# Altium footprint library Connectors.PcbLib: 408 footprints (part 20 of 26)
Each footprint in its own frame and in the unit in brackets; x right, y up, seen from the top. Pads: shape width x height; smd on the part's side, far side on the other; paste and mask are expansions set on the pad; w line width, h text height; cw(c..) or ccw(c..) is an arc to the next point about the centre after c.
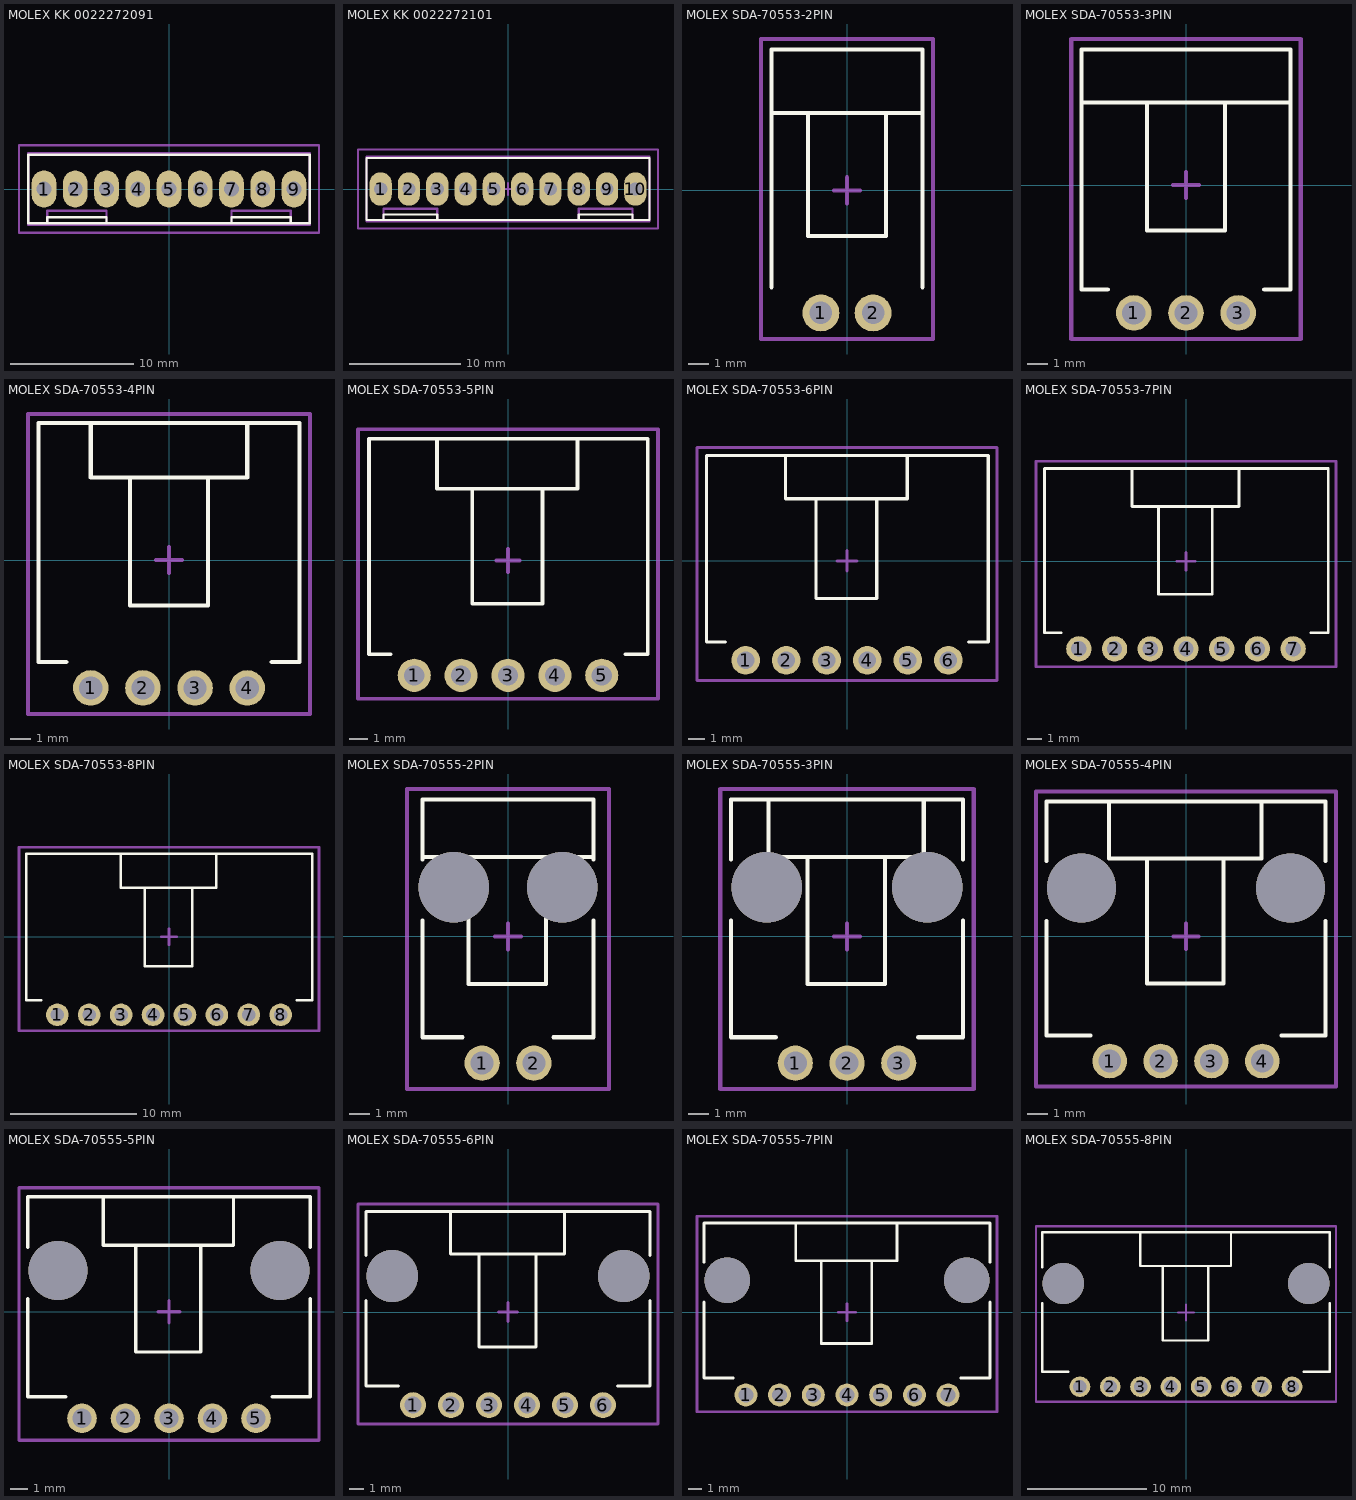
[diagram p19: the footprints below, top view; thin cyan lines are the x and y axes]

## MOLEX KK 0022272091 [mm]
height 11.6
pads (9):
  oval 2x3 hole 1.2: 1(-10.16,0) 2(-7.62,0) 3(-5.08,0) 4(-2.54,0) 5(0,0) 6(2.54,0) 7(5.08,0) 8(7.62,0) 9(10.16,0)
Top Overlay:
  lines w0.2: -9.906,-2.794 -9.906,-2.286 -5.08,-2.286 -5.08,-2.794 ; 5.08,-2.794 5.08,-2.286 9.906,-2.286 9.906,-2.794 ; -11.43,-2.794 -11.43,2.794 11.43,2.794 11.43,-2.794 -11.43,-2.794
Mechanical 13:
  lines w0.2: -9.906,-2.9 -9.906,-1.778 -5.08,-1.778 -5.08,-2.9 ; 5.08,-2.9 5.08,-1.778 9.906,-1.778 9.906,-2.9 ; -11.43,-2.9 11.43,-2.9 11.43,2.9 -11.43,2.9 -11.43,-2.9
Mechanical 15:
  lines w0.2: -0.508,0 0.508,0 ; 0,-0.508 0,0.508 ; -12.192,-3.556 12.192,-3.556 12.192,-1.016 12.192,3.556 -12.192,3.556 -12.192,-3.556
3D body "MOLEX KK 022272091.STEP": height 11.7, standoff -3.56, extent -11.43,-2.9 11.43,2.9

## MOLEX KK 0022272101 [mm]
height 11.6
pads (10):
  oval 2x3 hole 1.2: 1(-11.43,0) 2(-8.89,0) 3(-6.35,0) 4(-3.81,0) 5(-1.27,0) 6(1.27,0) 7(3.81,0) 8(6.35,0) 9(8.89,0) 10(11.43,0)
Top Overlay:
  lines w0.2: -11.176,-2.794 -11.176,-2.286 -6.35,-2.286 -6.35,-2.794 ; 6.35,-2.794 6.35,-2.286 11.176,-2.286 11.176,-2.794 ; -12.7,-2.794 12.7,-2.794 12.7,2.794 -12.7,2.794 -12.7,-2.794
Mechanical 13:
  lines w0.2: -11.176,-2.9 -11.176,-1.778 -6.35,-1.778 -6.35,-2.9 ; 6.35,-2.9 6.35,-1.778 11.176,-1.778 11.176,-2.9 ; -12.7,-2.9 -12.7,2.9 12.7,2.9 12.7,-2.9 -12.7,-2.9
Mechanical 15:
  lines w0.2: -0.508,0 0.508,0 ; 0,-0.508 0,0.508 ; -13.462,-3.556 -13.462,3.556 13.462,3.556 13.462,-1.016 13.462,-3.556 -13.462,-3.556
3D body "MOLEX KK 022272101.STEP": height 11.7, standoff -3.56, extent -12.7,-2.9 12.7,2.9

## MOLEX SDA-70553-2PIN [mm] "SL Right angle header with latch, 0.100 centres, SDA-70553"
height 6.99
pads (2):
  round 1.8 hole 1.09: 1(-1.27,-5.969) 2(1.27,-5.969)
Top Overlay:
  lines w0.2: -3.683,-4.719 -3.683,6.858 3.683,6.858 3.683,-4.719 ; -3.627,3.765 3.683,3.765 ; -1.905,3.765 -1.905,-2.219 1.905,-2.219 1.905,3.765
Mechanical 15:
  lines w0.2: -0.635,0 0.635,0 ; 0,-0.635 0,0.635 ; -4.191,-7.239 -4.191,7.366 4.191,7.366 4.191,-7.239 -4.191,-7.239
3D body "705530001.STEP": height 6.96, standoff -3.32, extent -3.683,-6.719 3.683,6.87

## MOLEX SDA-70553-3PIN [mm] "SL Right Angle Header W/LAtch & Trip-Pegs 2.54mm Centres"
height 6.99
pads (3):
  round 1.73 hole 1.13: 1(-2.54,-6.223) 2(0,-6.223) 3(2.54,-6.223)
Top Overlay:
  lines w0.2: -5.08,4.019 5.08,4.019 ; -3.81,-5.08 -5.08,-5.08 -5.08,6.604 5.08,6.604 5.08,-5.08 3.81,-5.08 ; -1.905,4.019 -1.905,-2.219 1.905,-2.219 1.905,4.019
Mechanical 15:
  lines w0.2: -0.635,0 0.635,0 ; 0,-0.635 0,0.635 ; -5.588,-7.493 -5.588,7.112 5.588,7.112 5.588,-7.493 -4.953,-7.493 -5.588,-7.493
3D body "705530002.STEP": height 6.98, standoff -3.3, extent -5.08,-6.923 5.08,6.666

## MOLEX SDA-70553-4PIN [mm] "SL Right Angle Header W/LAtch & Trip-Pegs 2.54mm Centres"
height 6.99
pads (4):
  round 1.73 hole 1.13: 1(-3.81,-6.223) 2(-1.27,-6.223) 3(1.27,-6.223) 4(3.81,-6.223)
Top Overlay:
  lines w0.2: -5,-4.953 -6.35,-4.953 -6.35,6.677 6.35,6.677 6.35,-4.953 5,-4.953 ; -3.81,6.677 -3.81,4.019 3.81,4.019 3.81,6.677 ; -1.905,4.019 -1.905,-2.219 1.905,-2.219 1.905,4.019
Mechanical 15:
  lines w0.2: -0.635,0 0.635,0 ; 0,-0.635 0,0.635 ; -6.858,-7.493 -6.858,7.112 6.858,7.112 6.858,-7.493 -6.858,-7.493
3D body "705530003.STEP": height 6.98, standoff -3.3, extent -6.35,-6.923 6.35,6.666

## MOLEX SDA-70553-5PIN [mm] "SL Right angle header with latch, 0.100 centres, SDA-70553"
height 6.99
pads (5):
  round 1.8 hole 1.09: 1(-5.08,-6.223) 2(-2.54,-6.223) 3(0,-6.223) 4(2.54,-6.223) 5(5.08,-6.223)
Top Overlay:
  lines w0.2: -6.35,-5.08 -7.533,-5.08 -7.533,-4.973 -7.533,6.604 7.58,6.604 7.58,-4.973 7.58,-5.08 6.35,-5.08 ; -3.85,6.55 -3.85,3.892 3.77,3.892 3.77,6.55 ; -1.945,3.892 -1.945,-2.346 1.865,-2.346 1.865,3.892
Mechanical 15:
  lines w0.2: -0.635,0 0.635,0 ; 0,-0.635 0,0.635 ; -8.128,-7.493 8.128,-7.493 8.128,7.112 -8.128,7.112 -8.128,-7.493
3D body "705530004.STEP": height 6.96, standoff -3.32, extent -7.58,-6.973 7.66,6.616

## MOLEX SDA-70553-6PIN [mm] "SL Right angle header with latch, 0.100 centres, SDA-70553"
height 6.99
pads (6):
  round 1.8 hole 1.09: 1(-6.35,-6.223) 2(-3.81,-6.223) 3(-1.27,-6.223) 4(1.27,-6.223) 5(3.81,-6.223) 6(6.35,-6.223)
Top Overlay:
  lines w0.2: -7.62,-5.08 -8.803,-5.08 -8.803,-4.973 -8.803,6.604 8.85,6.604 8.85,-4.973 8.85,-5.08 7.62,-5.08 ; -3.85,6.55 -3.85,3.892 3.77,3.892 3.77,6.55 ; -1.945,3.892 -1.945,-2.346 1.865,-2.346 1.865,3.892
Mechanical 15:
  lines w0.2: -0.635,0 0.635,0 ; 0,-0.635 0,0.635 ; -9.398,-7.493 -9.398,7.112 9.398,7.112 9.398,-7.493 -9.398,-7.493
3D body "705530005.STEP": height 6.96, standoff -3.32, extent -8.85,-6.973 8.93,6.616

## MOLEX SDA-70553-7PIN [mm] "SL Right angle header with latch, 0.100 centres, SDA-70553"
height 6.99
pads (7):
  round 1.8 hole 1.09: 1(-7.62,-6.223) 2(-5.08,-6.223) 3(-2.54,-6.223) 4(0,-6.223) 5(2.54,-6.223) 6(5.08,-6.223) 7(7.62,-6.223)
Top Overlay:
  lines w0.2: -8.89,-5.08 -10.073,-5.08 -10.073,-4.973 -10.073,6.604 10.12,6.604 10.12,-4.973 10.12,-5.08 8.89,-5.08 ; -3.85,6.55 -3.85,3.892 3.77,3.892 3.77,6.55 ; -1.945,3.892 -1.945,-2.346 1.865,-2.346 1.865,3.892
Mechanical 15:
  lines w0.2: -0.635,0 0.635,0 ; 0,-0.635 0,0.635 ; -10.668,-7.493 10.668,-7.493 10.668,7.112 -10.668,7.112 -10.668,-7.493
3D body "705530006.STEP": height 6.96, standoff -3.32, extent -10.12,-6.973 10.2,6.616

## MOLEX SDA-70553-8PIN [mm] "SL Right angle header with latch, 0.100 centres, SDA-70553"
height 6.99
pads (8):
  round 1.8 hole 1.09: 1(-8.89,-6.223) 2(-6.35,-6.223) 3(-3.81,-6.223) 4(-1.27,-6.223) 5(1.27,-6.223) 6(3.81,-6.223) 7(6.35,-6.223) 8(8.89,-6.223)
Top Overlay:
  lines w0.2: -10.16,-5.08 -11.343,-5.08 -11.343,-4.973 -11.343,6.604 11.39,6.604 11.39,-4.973 11.39,-5.08 10.16,-5.08 ; -3.85,6.55 -3.85,3.892 3.77,3.892 3.77,6.55 ; -1.945,3.892 -1.945,-2.346 1.865,-2.346 1.865,3.892
Mechanical 15:
  lines w0.2: -0.635,0 0.635,0 ; 0,-0.635 0,0.635 ; -11.938,-7.493 11.938,-7.493 11.938,7.112 -11.938,7.112 -11.938,-7.493
3D body "705530007.STEP": height 6.96, standoff -3.32, extent -11.39,-6.973 11.47,6.616

## MOLEX SDA-70555-2PIN [mm] "SL Right Angle Header W/LAtch & Trip-Pegs 2.54mm Centres"
height 6.99
pads (2):
  round 1.73 hole 1.13: 1(-1.27,-6.223) 2(1.27,-6.223)
via 2.67,2.417 diameter 3.45 hole 3.45
via -2.67,2.417 diameter 3.45 hole 3.45
Top Overlay:
  lines w0.2: -4.191,0.777 -4.191,-4.953 -2.23,-4.953 ; -4.191,3.777 -4.191,6.731 4.191,6.731 4.191,3.777 ; -4.191,3.892 4.191,3.892 ; -1.945,3.892 -1.945,-2.346 1.865,-2.346 1.865,3.892 ; 2.23,-4.953 4.191,-4.953 4.191,0.777
Mechanical 15:
  lines w0.2: -0.635,0 0.635,0 ; 0,-0.635 0,0.635 ; -4.953,-7.493 4.953,-7.493 4.953,7.239 -4.953,7.239 -4.953,-7.493
3D body "705550001.STEP": height 6.98, standoff -3.3, extent -4.191,-6.923 4.191,6.666

## MOLEX SDA-70555-3PIN [mm] "SL Right Angle Header W/LAtch & Trip-Pegs 2.54mm Centres"
height 6.99
pads (3):
  round 1.73 hole 1.13: 1(-2.54,-6.223) 2(0,-6.223) 3(2.54,-6.223)
via 3.94,2.417 diameter 3.45 hole 3.45
via -3.94,2.417 diameter 3.45 hole 3.45
Top Overlay:
  lines w0.2: -5.7,0.777 -5.7,-4.953 -3.5,-4.953 ; -5.7,3.777 -5.7,6.731 5.7,6.731 5.7,3.777 ; -3.85,6.731 -3.85,3.892 3.77,3.892 3.77,6.731 ; -1.945,3.892 -1.945,-2.346 1.865,-2.346 1.865,3.892 ; 3.5,-4.953 5.7,-4.953 5.7,0.777
Mechanical 15:
  lines w0.2: -0.635,0 0.635,0 ; 0,-0.635 0,0.635 ; -6.223,-7.493 6.223,-7.493 6.223,7.239 -6.223,7.239 -6.223,-7.493
3D body "705550002.STEP": height 6.98, standoff -3.3, extent -5.715,-6.923 5.715,6.666

## MOLEX SDA-70555-4PIN [mm] "SL Right Angle Header W/LAtch & Trip-Pegs 2.54mm Centres"
height 6.99
pads (4):
  round 1.73 hole 1.13: 1(-3.81,-6.223) 2(-1.27,-6.223) 3(1.27,-6.223) 4(3.81,-6.223)
via 5.21,2.417 diameter 3.45 hole 3.45
via -5.21,2.417 diameter 3.45 hole 3.45
Top Overlay:
  lines w0.2: -6.97,0.777 -6.97,-4.953 -4.77,-4.953 ; -6.97,3.777 -6.97,6.731 6.97,6.731 6.97,3.777 ; -3.85,6.731 -3.85,3.892 3.77,3.892 3.77,6.731 ; -1.945,3.892 -1.945,-2.346 1.865,-2.346 1.865,3.892 ; 4.77,-4.953 6.97,-4.953 6.97,0.777
Mechanical 15:
  lines w0.2: -0.635,0 0.635,0 ; 0,-0.635 0,0.635 ; -7.493,-7.493 7.493,-7.493 7.493,7.239 -7.493,7.239 -7.493,-7.493
3D body "705550003.STEP": height 6.98, standoff -3.3, extent -6.985,-6.923 6.985,6.666

## MOLEX SDA-70555-5PIN [mm] "SL Right Angle Header W/LAtch & Trip-Pegs 2.54mm Centres"
height 6.99
pads (5):
  round 1.73 hole 1.13: 1(-5.08,-6.223) 2(-2.54,-6.223) 3(0,-6.223) 4(2.54,-6.223) 5(5.08,-6.223)
via 6.48,2.417 diameter 3.45 hole 3.45
via -6.48,2.417 diameter 3.45 hole 3.45
Top Overlay:
  lines w0.2: -8.24,0.777 -8.24,-4.953 -6.04,-4.953 ; -8.24,3.777 -8.24,6.731 8.24,6.731 8.24,3.777 ; -3.85,6.731 -3.85,3.892 3.77,3.892 3.77,6.731 ; -1.945,3.892 -1.945,-2.346 1.865,-2.346 1.865,3.892 ; 6.04,-4.953 8.24,-4.953 8.24,0.777
Mechanical 15:
  lines w0.2: -0.635,0 0.635,0 ; 0,-0.635 0,0.635 ; -8.763,-7.493 8.763,-7.493 8.763,7.239 -8.763,7.239 -8.763,-7.493
3D body "705550004.STEP": height 6.98, standoff -3.3, extent -8.255,-6.923 8.255,6.666

## MOLEX SDA-70555-6PIN [mm] "SL Right Angle Header W/LAtch & Trip-Pegs 2.54mm Centres"
height 6.99
pads (6):
  round 1.73 hole 1.13: 1(-6.35,-6.223) 2(-3.81,-6.223) 3(-1.27,-6.223) 4(1.27,-6.223) 5(3.81,-6.223) 6(6.35,-6.223)
via 7.75,2.417 diameter 3.45 hole 3.45
via -7.75,2.417 diameter 3.45 hole 3.45
Top Overlay:
  lines w0.2: -9.51,0.777 -9.51,-4.953 -7.31,-4.953 ; -9.51,3.777 -9.51,6.731 9.51,6.731 9.51,3.777 ; -3.85,6.731 -3.85,3.892 3.77,3.892 3.77,6.731 ; -1.945,3.892 -1.945,-2.346 1.865,-2.346 1.865,3.892 ; 7.31,-4.953 9.51,-4.953 9.51,0.777
Mechanical 15:
  lines w0.2: -0.635,0 0.635,0 ; 0,-0.635 0,0.635 ; -10.033,-7.493 10.033,-7.493 10.033,7.239 -10.033,7.239 -10.033,-7.493
3D body "705550005.STEP": height 6.98, standoff -3.3, extent -9.525,-6.923 9.525,6.666

## MOLEX SDA-70555-7PIN [mm] "SL Right Angle Header W/LAtch & Trip-Pegs 2.54mm Centres"
height 6.99
pads (7):
  round 1.73 hole 1.13: 1(-7.62,-6.223) 2(-5.08,-6.223) 3(-2.54,-6.223) 4(0,-6.223) 5(2.54,-6.223) 6(5.08,-6.223) 7(7.62,-6.223)
via -9.02,2.417 diameter 3.45 hole 3.45
via 9.02,2.417 diameter 3.45 hole 3.45
Top Overlay:
  lines w0.2: -10.78,0.777 -10.78,-4.953 -8.58,-4.953 ; -10.78,3.777 -10.78,6.731 10.78,6.731 10.78,3.777 ; -3.85,6.731 -3.85,3.892 3.77,3.892 3.77,6.731 ; -1.945,3.892 -1.945,-2.346 1.865,-2.346 1.865,3.892 ; 8.58,-4.953 10.78,-4.953 10.78,0.777
Mechanical 15:
  lines w0.2: -0.635,0 0.635,0 ; 0,-0.635 0,0.635 ; -11.303,-7.493 -11.303,7.239 11.303,7.239 11.303,-7.493 -11.303,-7.493
3D body "705550006.STEP": height 6.98, standoff -3.3, extent -10.795,-6.923 10.795,6.666

## MOLEX SDA-70555-8PIN [mm] "SL Right Angle Header W/LAtch & Trip-Pegs 2.54mm Centres"
height 6.99
pads (8):
  round 1.73 hole 1.13: 1(-8.89,-6.223) 2(-6.35,-6.223) 3(-3.81,-6.223) 4(-1.27,-6.223) 5(1.27,-6.223) 6(3.81,-6.223) 7(6.35,-6.223) 8(8.89,-6.223)
via -10.29,2.417 diameter 3.45 hole 3.45
via 10.29,2.417 diameter 3.45 hole 3.45
Top Overlay:
  lines w0.2: -12.05,0.777 -12.05,-4.953 -9.85,-4.953 ; -12.05,3.777 -12.05,6.731 12.05,6.731 12.05,3.777 ; -3.85,6.731 -3.85,3.892 3.77,3.892 3.77,6.731 ; -1.945,3.892 -1.945,-2.346 1.865,-2.346 1.865,3.892 ; 9.85,-4.953 12.05,-4.953 12.05,0.777
Mechanical 15:
  lines w0.2: -0.635,0 0.635,0 ; 0,-0.635 0,0.635 ; -12.573,-7.493 -12.573,7.239 12.573,7.239 12.573,-7.493 -12.573,-7.493
3D body "705550007.STEP": height 6.98, standoff -3.3, extent -12.065,-6.923 12.065,6.666